# Altium footprint library IC.PcbLib: 160 footprints (part 5 of 10)
Each footprint in its own frame and in the unit in brackets; x right, y up, seen from the top. Pads: shape width x height; smd on the part's side, far side on the other; paste and mask are expansions set on the pad; w line width, h text height; cw(c..) or ccw(c..) is an arc to the next point about the centre after c.
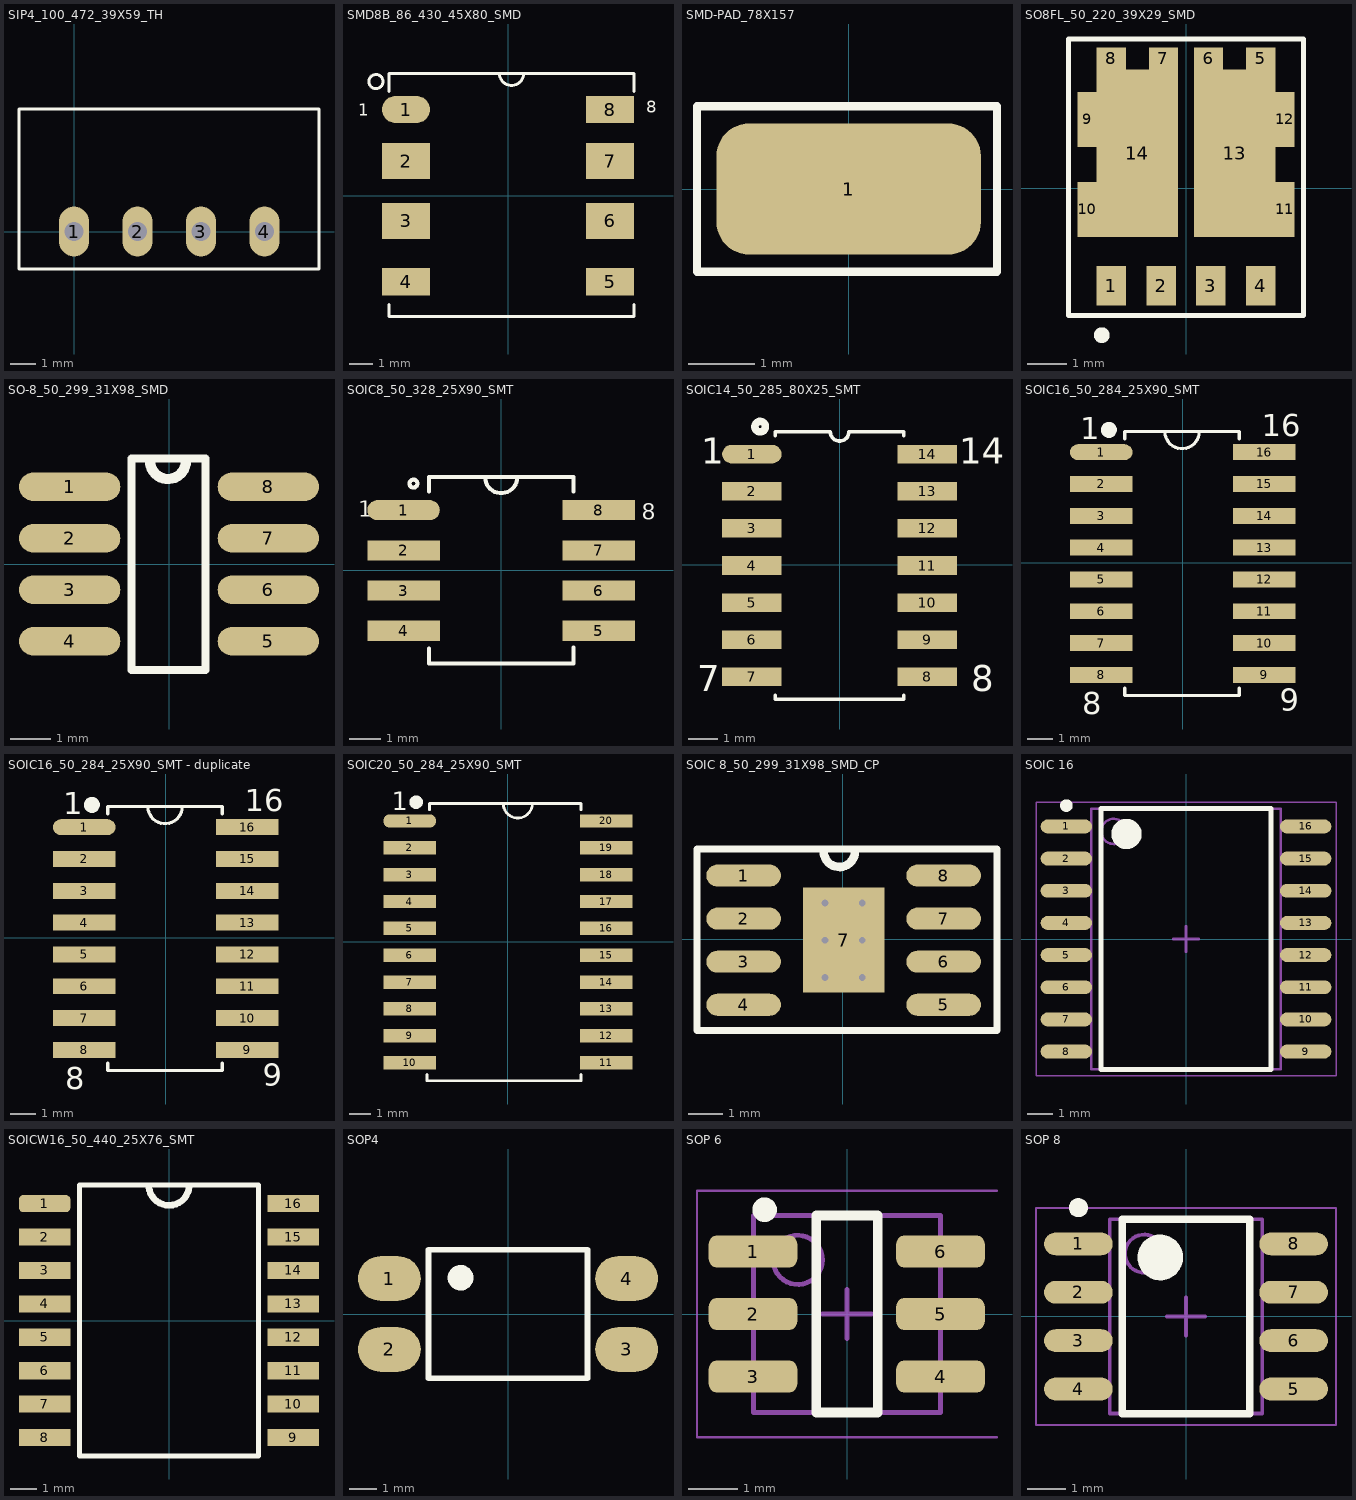
[diagram p4: the footprints below, top view; thin cyan lines are the x and y axes]

## SIP4_100_472_39X59_TH [mm] "SIP4"
height 9.982
pads (4):
  oval 1.2x2 hole 0.75 mask+0.076: 1(0,0) 2(2.54,0) 3(5.08,0) 4(7.62,0)
Top Overlay:
  lines w0.127: -1.095,4.9 9.8,4.9 9.8,-1.5 -2.2,-1.5 -2.2,4.9 -0.845,4.9
3D body "User Library-4-Lead SIP_AM1S-1205SZ_Aimtec_DC-DC_Converter_1_Watt.step": height 10.16, standoff -3.04, extent -2.042,-1.3 9.642,4.7

## SMD8B_86_430_45X80_SMD [mil] "SMD-8B"
height 144.88
pads (8):
  oval 80x45.67 smd mask+3: 1(-170,143.43)
  rect 80x59.84 smd mask+3: 2(-170,57.36) 3(-170,-42.4) 6(170,-42.4) 7(170,57.36)
  rect 80x45.67 smd mask+3: 4(-170,-143.43) 5(170,-143.43) 8(170,143.43)
Top Overlay:
  circle w5: c-220,190 r11.81
  lines w5: -198.19,-181.57 -198.19,-201.57 210,-201.57 210,-181.58 ; -198.19,173.43 -198.19,203.43 210,203.43 210,173.43 ; -14.09,203.43 ccw(c5.91,203.43) 25.91,203.43
  text "1" at -250,133.43 h20
  text "8" at 230,138.43 h20
3D body "User Library-SMD-8B.step": height 165.67, standoff 8.19, extent -187.91,-191.57 197.91,196.22

## SMD-PAD_78X157 [mil] "SMD PAD"
pads (1):
  rrect50% 157x78 smd: 1(0,0)
Top Overlay:
  lines w5: -90,-49 -90,49 88,49 88,-49 -90,-49

## SO8FL_50_220_39X29_SMD [mm] "CASE: SO8FL"
height 1.1
pads (14):
  rect 0.75x1 smd: 1(-1.905,-2.492) 2(-0.635,-2.492) 3(0.635,-2.492) 4(1.905,-2.492)
  rect 0.75x0.56 smd: 5(1.905,3.317) 6(0.575,3.317) 7(-0.575,3.317) 8(-1.905,3.317)
  rect 0.495x1.4 smd: 9(-2.527,1.757) 10(-2.527,-0.543) 11(2.527,-0.543) 12(2.527,1.757)
  rect 2.08x4.28 smd: 13(1.24,0.897) 14(-1.24,0.897)
Top Overlay:
  lines w0.127: -3,-3.25 3,-3.25 3,3.81 -3,3.81 -3,-3.25
  lines w0.2: -2.25,-3.75 ccw(c-2.15,-3.75) -2.05,-3.75 ccw(c-2.15,-3.75) -2.25,-3.75
3D body "User Library-DFN8-5X6 DUAL.step": height 1.11, standoff 0.01, extent -2.575,-2.775 2.575,3.375

## SO-8_50_299_31X98_SMD [mm] "SOIC, 8-Leads, Body 4.9x3.9mm, Pitch 1.27mm, IPC Low Density"
height 1.75
pads (8):
  oval 2.5x0.7 smd: 1(-2.45,1.905) 2(-2.45,0.635) 3(-2.45,-0.635) 4(-2.45,-1.905) 5(2.45,-1.905) 6(2.45,-0.635) 7(2.45,0.635) 8(2.45,1.905)
Top Overlay:
  lines w0.2: -0.925,-2.616 0.9,-2.616 0.9,2.6 -0.925,2.6 -0.925,-2.616
  lines w0.254: -0.466,2.489 ccw(c-0.025,2.54) 0.418,2.54
3D body "SO-8.STEP": height 1.5, standoff 0, extent -2.76,-2.45 3.268,2.45

## SOIC8_50_328_25X90_SMT [mil] "SOIC"
height 68.9
pads (8):
  oval 90x25 smd mask+3: 1(-121.32,75)
  rect 90x25 smd mask+3: 2(-121.32,25) 3(-121.32,-25) 4(-121.32,-75) 5(121.32,-75) 6(121.32,-25) 7(121.32,25) 8(121.32,75)
Top Overlay:
  circle w5: c-109,108 r4.92
  lines w5: -90,-97 -90,-116 90,-116 90,-96 ; -90,98 -90,116 90,116 90,98 ; -20,116 ccw(c0,116) 20,116
  text "8" at 175,63 h20
  text "1" at -178,67 h20
3D body "SOIC08 narrow.stp": height 78.74, standoff 0.13, extent -121.32,-98.42 121.32,98.43

## SOIC14_50_285_80X25_SMT [mil] "SOIC, 14-Leads, Body 8.56x3.90mm, Pitch 1.27mm, IPC Medium Density"
height 104.33
pads (14):
  oval 80x25 smd: 1(-118.11,149.01)
  rect 80x25 smd: 2(-118.11,99.01) 3(-118.11,49.01) 4(-118.11,-0.99) 5(-118.11,-50.99) 6(-118.11,-100.99) 7(-118.11,-150.99) 8(118.11,-150.99) 9(118.11,-100.99) 10(118.11,-50.99) 11(118.11,-0.99) 12(118.11,49.01) 13(118.11,99.01) 14(118.11,149.01)
Top Overlay:
  circle w10: c-107,186 r7.07
  lines w5: -86.51,-175.99 -86.51,-180.99 85.99,-180.99 ; -86.51,174.01 -86.51,179.01 ; -85.01,179.01 -13.01,179.01 ; -12.51,179.01 ccw(c-0.01,179.01) 12.49,179.01 ; 12.99,179.01 85.99,179.01 ; 86.49,-180.99 86.49,-175.99 ; 86.49,174.01 86.49,179.01
  text "1" at -186.01,136.01 h35
  text "14" at 160.99,136.01 h35
  text "7" at -192.01,-169.99 h35
  text "8" at 176.99,-169.99 h35
3D body "SOIC127P620X265-14N.step": height 104.33, standoff 0, extent -120,-169.29 122.13,169.29
3D body "so14-1.step": height 65.93, standoff -1, extent -118.11,-174.21 118.11,172.25

## SOIC16_50_284_25X90_SMT [mm]
pads (16):
  oval 2.5x0.635 smd mask+0.076: 1(-3.25,4.42)
  rect 2.5x0.635 smd mask+0.076: 2(-3.25,3.15) 3(-3.25,1.88) 4(-3.25,0.61) 5(-3.25,-0.66) 6(-3.25,-1.93) 7(-3.25,-3.2) 8(-3.25,-4.47) 9(3.25,-4.47) 10(3.25,-3.2) 11(3.25,-1.93) 12(3.25,-0.66) 13(3.25,0.61) 14(3.25,1.88) 15(3.25,3.15) 16(3.25,4.42)
Top Overlay:
  circle w0.381: c-2.946,5.309 r0.127
  lines w0.127: -2.311,-5.003 -2.311,-5.295 2.261,-5.295 2.261,-5.003 ; -2.311,4.953 -2.311,5.246 2.261,5.246 2.261,4.953 ; -0.712,5.246 ccw(c-0.025,5.246) 0.662,5.246
  text "1" at -4.089,4.928 h0.89
  text "8" at -4.016,-6.032 h0.89
  text "9" at 3.878,-5.909 h0.89
  text "16" at 3.15,5.055 h0.89
3D body "SOIC-16-1.step": height 1.4, standoff 0, extent -3.025,-4.975 2.975,4.925

## SOIC16_50_284_25X90_SMT - duplicate [mm]
pads (16):
  oval 2.5x0.635 smd mask+0.076: 1(-3.25,4.42)
  rect 2.5x0.635 smd mask+0.076: 2(-3.25,3.15) 3(-3.25,1.88) 4(-3.25,0.61) 5(-3.25,-0.66) 6(-3.25,-1.93) 7(-3.25,-3.2) 8(-3.25,-4.47) 9(3.25,-4.47) 10(3.25,-3.2) 11(3.25,-1.93) 12(3.25,-0.66) 13(3.25,0.61) 14(3.25,1.88) 15(3.25,3.15) 16(3.25,4.42)
Top Overlay:
  circle w0.381: c-2.946,5.309 r0.127
  lines w0.127: -2.311,-5.003 -2.311,-5.295 2.261,-5.295 2.261,-5.003 ; -2.311,4.953 -2.311,5.246 2.261,5.246 2.261,4.953 ; -0.712,5.246 ccw(c-0.025,5.246) 0.662,5.246
  text "1" at -4.089,4.928 h0.89
  text "8" at -4.016,-6.032 h0.89
  text "9" at 3.878,-5.909 h0.89
  text "16" at 3.15,5.055 h0.89
3D body "SOIC-16-1.step": height 1.4, standoff 0, extent -3.025,-4.975 2.975,4.925

## SOIC20_50_284_25X90_SMT [mm]
pads (20):
  oval 2.5x0.635 smd mask+0.076: 1(-4.65,5.715)
  rect 2.5x0.635 smd mask+0.076: 2(-4.65,4.445) 3(-4.65,3.175) 4(-4.65,1.905) 5(-4.65,0.635) 6(-4.65,-0.635) 7(-4.65,-1.905) 8(-4.65,-3.175) 9(-4.65,-4.445) 10(-4.65,-5.715) 11(4.65,-5.715) 12(4.65,-4.445) 13(4.65,-3.175) 14(4.65,-1.905) 15(4.65,-0.635) 16(4.65,0.635) 17(4.65,1.905) 18(4.65,3.175) 19(4.65,4.445) 20(4.65,5.715)
Top Overlay:
  circle w0.381: c-4.346,6.604 r0.127
  lines w0.127: -3.836,-6.283 -3.836,-6.575 3.45,-6.575 3.45,-6.283 ; -3.711,6.248 -3.711,6.54 3.45,6.54 3.45,6.248 ; -0.224,6.54 ccw(c0.463,6.54) 1.15,6.54
  text "1" at -5.489,6.223 h0.89
3D body "User Library-SOIC20.step": height 2.25, standoff 0.01, extent -5.067,-6.3 5.067,6.3

## SOIC 8_50_299_31X98_SMD_CP [mm]
pads (9):
  oval 2.2x0.65 smd: 1(-2.925,1.88) 2(-2.925,0.61) 3(-2.925,-0.66) 4(-2.925,-1.93) 5(2.975,-1.93) 6(2.975,-0.66) 7(2.975,0.61) 8(2.975,1.88)
  rect 2.4x3.1 smd: 7(0.025,-0.025)
via -0.525,1.075 diameter 0.5 hole 0.2
via 0.575,1.075 diameter 0.5 hole 0.2
via -0.525,-0.025 diameter 0.5 hole 0.2
via 0.575,-0.025 diameter 0.5 hole 0.2
via -0.525,-1.125 diameter 0.5 hole 0.2
via 0.575,-1.125 diameter 0.5 hole 0.2
Top Overlay:
  lines w0.2: -4.3,-2.692 -4.3,2.667 4.55,2.667 4.55,-2.692 -4.3,-2.692
  lines w0.254: -0.559,2.615 ccw(c-0.102,2.591) 0.356,2.591
3D body "SOIC127P600-8N.step": height 1.7, standoff 0, extent -2.974,-2.525 3.025,2.475

## SOIC 16 [mm] "SOIC, 16-Leads, Body 10.30x7.50mm, Pitch 1.27mm, IPC Medium Density"
height 2.4
pads (16):
  oval 2.032x0.55 smd: 1(-4.725,4.445) 2(-4.725,3.175) 3(-4.725,1.905) 4(-4.725,0.635) 5(-4.725,-0.635) 6(-4.725,-1.905) 7(-4.725,-3.175) 8(-4.725,-4.445) 9(4.725,-4.445) 10(4.725,-3.175) 11(4.725,-1.905) 12(4.725,-0.635) 13(4.725,0.635) 14(4.725,1.905) 15(4.725,3.175) 16(4.725,4.445)
Top Overlay:
  circle w0.6: c-2.35,4.15 r0.3
  circle w0.25: c-4.725,5.27 r0.125
  lines w0.2: -3.35,-5.15 3.35,-5.15 3.35,5.15 -3.35,5.15 -3.35,-5.15
Mechanical 13:
  circle w0.1: c-2.85,4.25 r0.5
  lines w0.1: -3.75,-5.15 3.75,-5.15 3.75,5.15 -3.75,5.15 -3.75,-5.15
Mechanical 15:
  lines w0.05: -5.925,-5.4 5.925,-5.4 5.925,5.4 -5.925,5.4 -5.925,-5.4
  lines w0.1: -0.5,0 0.5,0 ; 0,-0.5 0,0.5
3D body "User Library-SO-16W.STEP": height 2.48, standoff 0, extent -5.155,-5.165 5.155,5.165

## SOICW16_50_440_25X76_SMT [mm] "SOICW"
height 2.6
pads (16):
  rrect50% 1.95x0.65 smd: 1(-4.725,4.445)
  rect 1.95x0.65 smd: 2(-4.725,3.175) 3(-4.725,1.905) 4(-4.725,0.635) 5(-4.725,-0.635) 6(-4.725,-1.905) 7(-4.725,-3.175) 8(-4.725,-4.445) 9(4.725,-4.445) 10(4.725,-3.175) 11(4.725,-1.905) 12(4.725,-0.635) 13(4.725,0.635) 14(4.725,1.905) 15(4.725,3.175) 16(4.725,4.445)
Top Overlay:
  lines w0.2: -3.4,-5.15 3.4,-5.15 3.4,5.15 -3.4,5.15 -3.4,-5.15
  lines w0.254: -0.767,5.077 ccw(c0,5.15) 0.769,5.105
3D body "ACS720KLATR-65AB-T.stp": height 2.65, standoff 0, extent -5.15,-5.15 5.15,5.15

## SOP4 [mm]
pads (4):
  oval 2.25x1.6 smd: 1(-4.25,1.27) 2(-4.25,-1.27) 3(4.25,-1.27) 4(4.25,1.27)
Top Overlay:
  circle w0.2: c-1.7,1.3 r0.361
  region: -1.4,1.003 -2.006,1.003 -2.006,1.6 -1.4,1.6
  lines w0.2: -2.85,-2.3 2.85,-2.3 2.85,2.3 -2.85,2.3 -2.85,-2.3
3D body "pc817x1nip1b.stp": height 3.6, standoff 0, extent -4.673,-2.286 4.927,2.314

## SOP 6 [mm] "SOP6"
height 1.1
pads (6):
  rrect50% 1.8x0.65 smd: 1(-1.91,1.27) 2(-1.91,0) 3(-1.91,-1.27) 4(1.9,-1.27) 5(1.9,0) 6(1.9,1.27)
Top Overlay:
  circle w0.25: c-1.675,2.12 r0.125
  lines w0.2: -0.625,-2 0.625,-2 0.625,2 -0.625,2 -0.625,-2
Mechanical 13:
  circle w0.1: c-1,1.1 r0.5
  lines w0.1: -1.9,-2 1.9,-2 1.9,2 -1.9,2 -1.9,-2
Mechanical 15:
  lines w0.05: 3.048,-2.5 -3.048,-2.5 -3.048,2.5 3.048,2.5
  lines w0.1: -0.5,0 0.5,0 ; 0,-0.5 0,0.5
3D body "SOIC127P490X150-6N.step": height 1.5, standoff 0, extent -2.45,-2 2.45,2

## SOP 8 [mm] "SOIC, 8-Leads, Body 4.9x3.9mm, Pitch 1.27mm, IPC High Density"
pads (8):
  oval 1.8x0.6 smd: 1(-2.825,1.905) 2(-2.825,0.635) 3(-2.825,-0.635) 4(-2.825,-1.905) 5(2.825,-1.905) 6(2.825,-0.635) 7(2.825,0.635) 8(2.825,1.905)
Top Overlay:
  circle w0.6: c-0.675,1.55 r0.3
  circle w0.25: c-2.825,2.855 r0.125
  lines w0.2: -1.675,-2.55 1.675,-2.55 1.675,2.55 -1.675,2.55 -1.675,-2.55
Mechanical 13:
  circle w0.1: c-1.1,1.65 r0.5
  lines w0.1: -2,-2.55 2,-2.55 2,2.55 -2,2.55 -2,-2.55
Mechanical 15:
  lines w0.05: -3.937,-2.85 3.937,-2.85 3.937,2.85 -3.937,2.85 -3.937,-2.85
  lines w0.1: -0.5,0 0.5,0 ; 0,-0.5 0,0.5
3D body "CircuitWorks-SO-8 (PIC12FXXX).step": height 1.6, standoff 0, extent -2.995,-2.45 2.995,2.45